# Altium footprint library Lib_Global.PcbLib: 96 footprints (part 1 of 6)
Each footprint in its own frame and in the unit in brackets; x right, y up, seen from the top. Pads: shape width x height; smd on the part's side, far side on the other; paste and mask are expansions set on the pad; w line width, h text height; cw(c..) or ccw(c..) is an arc to the next point about the centre after c.
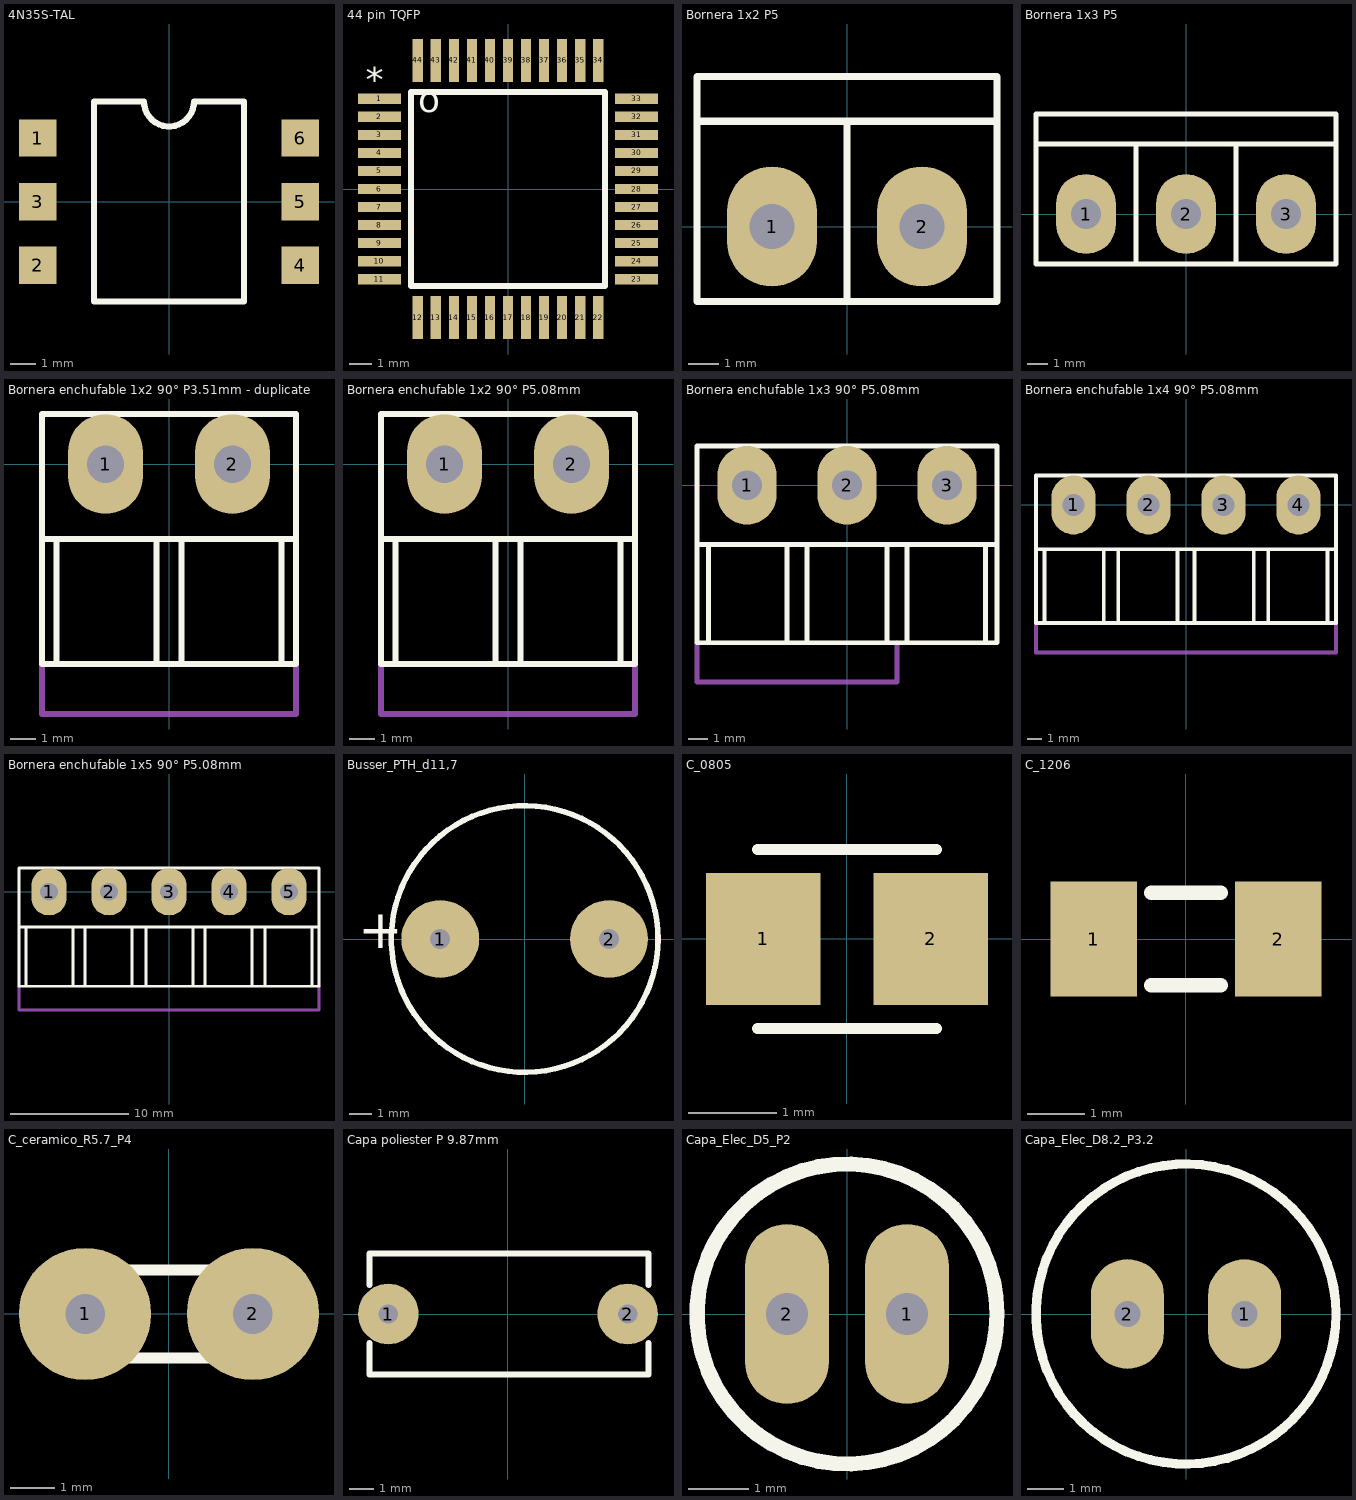
[diagram p0: the footprints below, top view; thin cyan lines are the x and y axes]

## 4N35S-TAL [mm]
pads (6):
  rect 1.5x1.5 smd: 1(-5.25,2.54) 2(-5.25,-2.54) 3(-5.25,0) 4(5.25,-2.54) 5(5.25,0) 6(5.25,2.54)
Top Overlay:
  lines w0.25: -3,-4 3,-4 3,4 1,4 cw(c0,4) -1,4 -3,4 -3,-4

## 44 pin TQFP [mm]
pads (44):
  rect 1.9x0.45 smd: 1(-5.7,4) 2(-5.7,3.2) 3(-5.7,2.4) 4(-5.7,1.6) 5(-5.7,0.8) 6(-5.7,0) 7(-5.7,-0.8) 8(-5.7,-1.6) 9(-5.7,-2.4) 10(-5.7,-3.2) 11(-5.7,-4) 23(5.7,-4) 24(5.7,-3.2) 25(5.7,-2.4) 26(5.7,-1.6) 27(5.7,-0.8) 28(5.7,0) 29(5.7,0.8) 30(5.7,1.6) 31(5.7,2.4) 32(5.7,3.2) 33(5.7,4)
  rect 0.45x1.9 smd: 12(-4,-5.7) 13(-3.2,-5.7) 14(-2.4,-5.7) 15(-1.6,-5.7) 16(-0.8,-5.7) 17(0,-5.7) 18(0.8,-5.7) 19(1.6,-5.7) 20(2.4,-5.7) 21(3.2,-5.7) 22(4,-5.7) 34(4,5.7) 35(3.2,5.7) 36(2.4,5.7) 37(1.6,5.7) 38(0.8,5.7) 39(0,5.7) 40(-0.8,5.7) 41(-1.6,5.7) 42(-2.4,5.7) 43(-3.2,5.7) 44(-4,5.7)
Top Overlay:
  lines w0.25: -4.3,-4.3 -4.3,4.3 4.3,4.3 4.3,-4.3 -4.3,-4.3
  text "*" at -5.5,3.9 h2
  text "o" at -3,3 h2

## Bornera 1x2 P5 [mm]
pads (2):
  oval 3x4 hole 1.5 mask+0.102: 1(-2.5,0) 2(2.5,0)
Top Overlay:
  lines w0.25: -5,4 -5,-2.5 5,-2.5 5,5 -5,5 -5,3.5 4.5,3.5 ; 0,-2.5 0,3.5 ; 2.5,3.5 4.9,3.5
3D body "User Library-bornera-1.sldprt": height 10, standoff -3.75, extent -5.5,-2.5 5,5.1

## Bornera 1x3 P5 [mm]
pads (3):
  oval 3x4 hole 1.5 mask+0.102: 1(-5,0) 2(0,0) 3(5,0)
Top Overlay:
  lines w0.25: -7.5,4 -7.5,-2.5 7.5,-2.5 7.5,5 -7.5,5 -7.5,3.5 2,3.5 ; -2.5,-2.5 -2.5,3.5 7.5,3.5 ; 2.5,-2.5 2.5,3.5
3D body "User Library-bornera-1.sldprt": height 10, standoff -3.75, extent -3,-2.5 7.5,5.1
3D body "User Library-bornera-1.sldprt": height 10, standoff -3.75, extent -8,-2.5 2.5,5.1

## Bornera enchufable 1x2 90° P3.51mm - duplicate [mm]
pads (2):
  oval 3x4 hole 1.5: 1(-2.54,0) 2(2.54,0)
Top Overlay:
  lines w0.25: -5,-3 5,-3 ; -4.5,-8 -4.5,-3 ; -0.5,-8 -0.5,-3 ; 0.5,-8 0.5,-3 ; 4.5,-8 4.5,-3 ; -5.08,-8 5.08,-8 5.08,2 -5.08,2 -5.08,-8
Mechanical 15:
  lines w0.25: -5.08,-8 -5.08,-10 5.08,-10 5.08,-8
3D body: height 2, standoff 0, extent -5.08,-10.16 5.08,1.905
3D body: height 7, standoff 2, extent -5.08,-1.27 5.08,1.905
3D body: height 8, standoff 7, extent -5.08,-10.16 5.08,1.905
3D body: height 4.5, standoff 2.5, extent -3.536,-7.75 -1.544,-1.25
3D body: height 4.5, standoff 2.5, extent 1.548,-7.73 3.54,-1.23

## Bornera enchufable 1x2 90° P5.08mm [mm]
pads (2):
  oval 3x4 hole 1.5: 1(-2.54,0) 2(2.54,0)
Top Overlay:
  lines w0.25: -5,-3 5,-3 ; -4.5,-8 -4.5,-3 ; -0.5,-8 -0.5,-3 ; 0.5,-8 0.5,-3 ; 4.5,-8 4.5,-3 ; -5.08,-8 5.08,-8 5.08,2 -5.08,2 -5.08,-8
Mechanical 15:
  lines w0.25: -5.08,-8 -5.08,-10 5.08,-10 5.08,-8
3D body: height 2, standoff 0, extent -5.08,-10.16 5.08,1.905
3D body: height 7, standoff 2, extent -5.08,-1.27 5.08,1.905
3D body: height 8, standoff 7, extent -5.08,-10.16 5.08,1.905
3D body: height 4.5, standoff 2.5, extent -3.536,-7.75 -1.544,-1.25
3D body: height 4.5, standoff 2.5, extent 1.548,-7.73 3.54,-1.23

## Bornera enchufable 1x3 90° P5.08mm [mm]
pads (3):
  oval 3x4 hole 1.5: 1(-5.08,0) 2(0,0) 3(5.08,0)
Top Overlay:
  lines w0.25: -7.54,-3 7.54,-3 ; -7.04,-8 -7.04,-3 ; -3.04,-8 -3.04,-3 ; -2.04,-8 -2.04,-3 ; 2.04,-8 2.04,-3 ; 3.04,-8 3.04,-3 ; 7.04,-8 7.04,-3 ; -7.62,-8 7.62,-8 7.62,2 -7.62,2 -7.62,-8
Mechanical 15:
  lines w0.25: -7.62,-8 -7.62,-10 2.54,-10 2.54,-8
3D body: height 1, standoff -0.2, extent 4.58,-0.5 5.58,0.5
3D body: height 1, standoff -0.2, extent -5.58,-0.5 -4.58,0.5
3D body: height 1, standoff -0.2, extent -0.504,-0.5 0.496,0.5
3D body: height 0.5, standoff -0.5, extent -0.496,-0.498 0.496,0.498
3D body: height 0.25, standoff 0, extent 0,0 0,0
3D body: height 4.5, standoff 2.5, extent 4.088,-7.69 6.08,-1.19
3D body: height 2, standoff 0, extent -7.62,-10.16 7.62,1.905
3D body: height 7, standoff 2, extent -7.62,-1.27 7.62,1.905
3D body: height 8, standoff 7, extent -7.62,-10.16 7.62,1.905
3D body: height 4.5, standoff 2.5, extent -6.076,-7.75 -4.084,-1.25
3D body: height 4.5, standoff 2.5, extent -0.992,-7.73 1,-1.23

## Bornera enchufable 1x4 90° P5.08mm [mm]
pads (4):
  oval 3x4 hole 1.5: 1(-7.62,0) 2(-2.54,0) 3(2.54,0) 4(7.62,0)
Top Overlay:
  lines w0.25: -10.08,-3 10.16,-3 ; -9.58,-8 -9.58,-3 ; -5.58,-8 -5.58,-3 ; -4.58,-8 -4.58,-3 ; -0.58,-8 -0.58,-3 ; 0.58,-8 0.58,-3 ; 4.58,-8 4.58,-3 ; 5.58,-8 5.58,-3 ; 9.58,-8 9.58,-3 ; -10.16,-8 10.16,-8 10.16,2 -10.16,2 -10.16,-8
Mechanical 15:
  lines w0.25: -10.16,-8 -10.16,-10 10.16,-10 10.16,-8
3D body: height 2, standoff 0, extent -10.16,-10.16 0,1.905
3D body: height 7, standoff 2, extent -10.16,-1.27 0,1.905
3D body: height 8, standoff 7, extent -10.16,-10.16 0,1.905
3D body: height 4.5, standoff 2.5, extent -8.616,-7.75 -6.624,-1.25
3D body: height 4.5, standoff 2.5, extent -3.532,-7.73 -1.54,-1.23
3D body: height 8, standoff 7, extent 0,-10.16 10.16,1.905
3D body: height 4.5, standoff 2.5, extent 1.544,-7.75 3.536,-1.25
3D body: height 4.5, standoff 2.5, extent 6.624,-7.75 8.616,-1.25
3D body: height 7, standoff 2, extent 0,-1.27 10.16,1.905
3D body: height 2, standoff 0, extent -0.004,-10.16 10.156,1.905

## Bornera enchufable 1x5 90° P5.08mm [mm]
pads (5):
  oval 3x4 hole 1.5: 1(-10.16,0) 2(-5.08,0) 3(0,0) 4(5.08,0) 5(10.16,0)
Top Overlay:
  lines w0.25: -12.62,-3 12.7,-3 ; -12.12,-8 -12.12,-3 ; -8.12,-8 -8.12,-3 ; -7.12,-8 -7.12,-3 ; -3.12,-8 -3.12,-3 ; -1.96,-8 -1.96,-3 ; 2.04,-8 2.04,-3 ; 3.04,-8 3.04,-3 ; 7.04,-8 7.04,-3 ; 8.12,-8 8.12,-3 ; 12.12,-8 12.12,-3 ; -12.7,-8 -12.7,2 12.7,2 12.7,-8 -12.7,-8
Mechanical 15:
  lines w0.25: -12.7,-8 -12.7,-10 12.7,-10 12.7,-8
3D body: height 8, standoff 7, extent 2.54,-10.16 12.7,1.905
3D body: height 7, standoff 2, extent 2.54,-1.27 12.7,1.905
3D body: height 7, standoff 2, extent 2.54,-1.27 12.7,1.905
3D body: height 2, standoff 0, extent 2.536,-10.16 12.696,1.905
3D body: height 4.5, standoff 2.5, extent 9.164,-7.75 11.156,-1.25
3D body: height 2, standoff 0, extent -2.544,-10.16 7.616,1.905
3D body: height 7, standoff 2, extent -2.54,-1.27 7.62,1.905
3D body: height 4.5, standoff 2.5, extent 4.084,-7.75 6.076,-1.25
3D body: height 4.5, standoff 2.5, extent -0.996,-7.75 0.996,-1.25
3D body: height 8, standoff 7, extent -2.54,-10.16 7.62,1.905
3D body: height 4.5, standoff 2.5, extent -6.072,-7.73 -4.08,-1.23
3D body: height 4.5, standoff 2.5, extent -11.156,-7.75 -9.164,-1.25
3D body: height 8, standoff 7, extent -12.7,-10.16 -2.54,1.905
3D body: height 7, standoff 2, extent -12.7,-1.27 -2.54,1.905
3D body: height 2, standoff 0, extent -12.7,-10.16 -2.54,1.905

## Busser_PTH_d11,7 [mm]
pads (2):
  round 3.5 hole 0.9: 1(-3.8,0) 2(3.8,0)
Top Overlay:
  circle w0.25: c0,0 r6
  text "+" at -7.5,-1 h3
3D body "ALSRobot-BUZZER.SLDPRT": height 9.65, standoff -4.5, extent -9.454,-6 6,6

## C_0805 [mm]
pads (2):
  rect 1.3x1.5 smd: 1(-0.95,0) 2(0.95,0)
Top Overlay:
  lines w0.127: -1.016,-1.016 1.016,-1.016 ; -1.016,1.016 1.016,1.016
3D body "rnd_1500805y104z160nt.SLDPRT": height 1.25, standoff 0, extent -0.975,-0.6 1.025,0.65

## C_1206 [mm]
pads (2):
  rect 1.5x2 smd: 1(-1.6,0) 2(1.6,0)
Top Overlay:
  lines w0.25: -0.6,-0.8 0.6,-0.8 ; -0.6,0.8 0.6,0.8
3D body "User Library-cap_1206_1_25.sldprt": height 1.25, standoff 0, extent -1.6,-0.8 1.6,0.8

## C_ceramico_R5.7_P4 [mm]
pads (2):
  round 3 hole 0.9: 1(-1.905,0) 2(1.905,0)
Top Overlay:
  lines w0.25: -2.8,-1 2.8,-1 ; -2.8,1 2.8,1

## Capa poliester P 9.87mm [mm]
pads (2):
  round 2.5 hole 0.8: 1(-4.935,0) 2(4.935,0)
Top Overlay:
  lines w0.25: -5.715,-1.2 -5.715,-2.5 5.785,-2.5 5.785,-1.2 ; -5.715,1.2 -5.715,2.5 5.785,2.5 5.785,1.2
3D body "User Library-Capacitor MKT_B32591C3104 (Pitch 10mm).sldprt": height 12.5, standoff -6, extent -6.5,-2.5 6.5,2.5

## Capa_Elec_D5_P2 [mm]
pads (2):
  oval 1.4x3 hole 0.7: 1(1,0) 2(-1,0)
Top Overlay:
  circle w0.254: c0,0 r2.5
  text "-" at -2.5,-0.3 h1
3D body "User Library-Cap electro 5x11x2mm.sldprt": height 11.53, standoff -3.27, extent -2.525,-2.525 2.525,2.525

## Capa_Elec_D8.2_P3.2 [mm]
pads (2):
  oval 2x3 hole 0.7: 1(1.6,0) 2(-1.6,0)
Top Overlay:
  circle w0.254: c0,0 r4.1
  text "-" at -3.75,-1 h2.5
3D body "CircuitWorks-ELECTROLITIC CAPACITOR RADIAL 8X12.SLDPRT": height 12, standoff -2.5, extent -4,-4 4,4